# Altium footprint library PCB_ConnectorHDR.PcbLib: 109 footprints (part 3 of 7)
Each footprint in its own frame and in the unit in brackets; x right, y up, seen from the top. Pads: shape width x height; smd on the part's side, far side on the other; paste and mask are expansions set on the pad; w line width, h text height; cw(c..) or ccw(c..) is an arc to the next point about the centre after c.
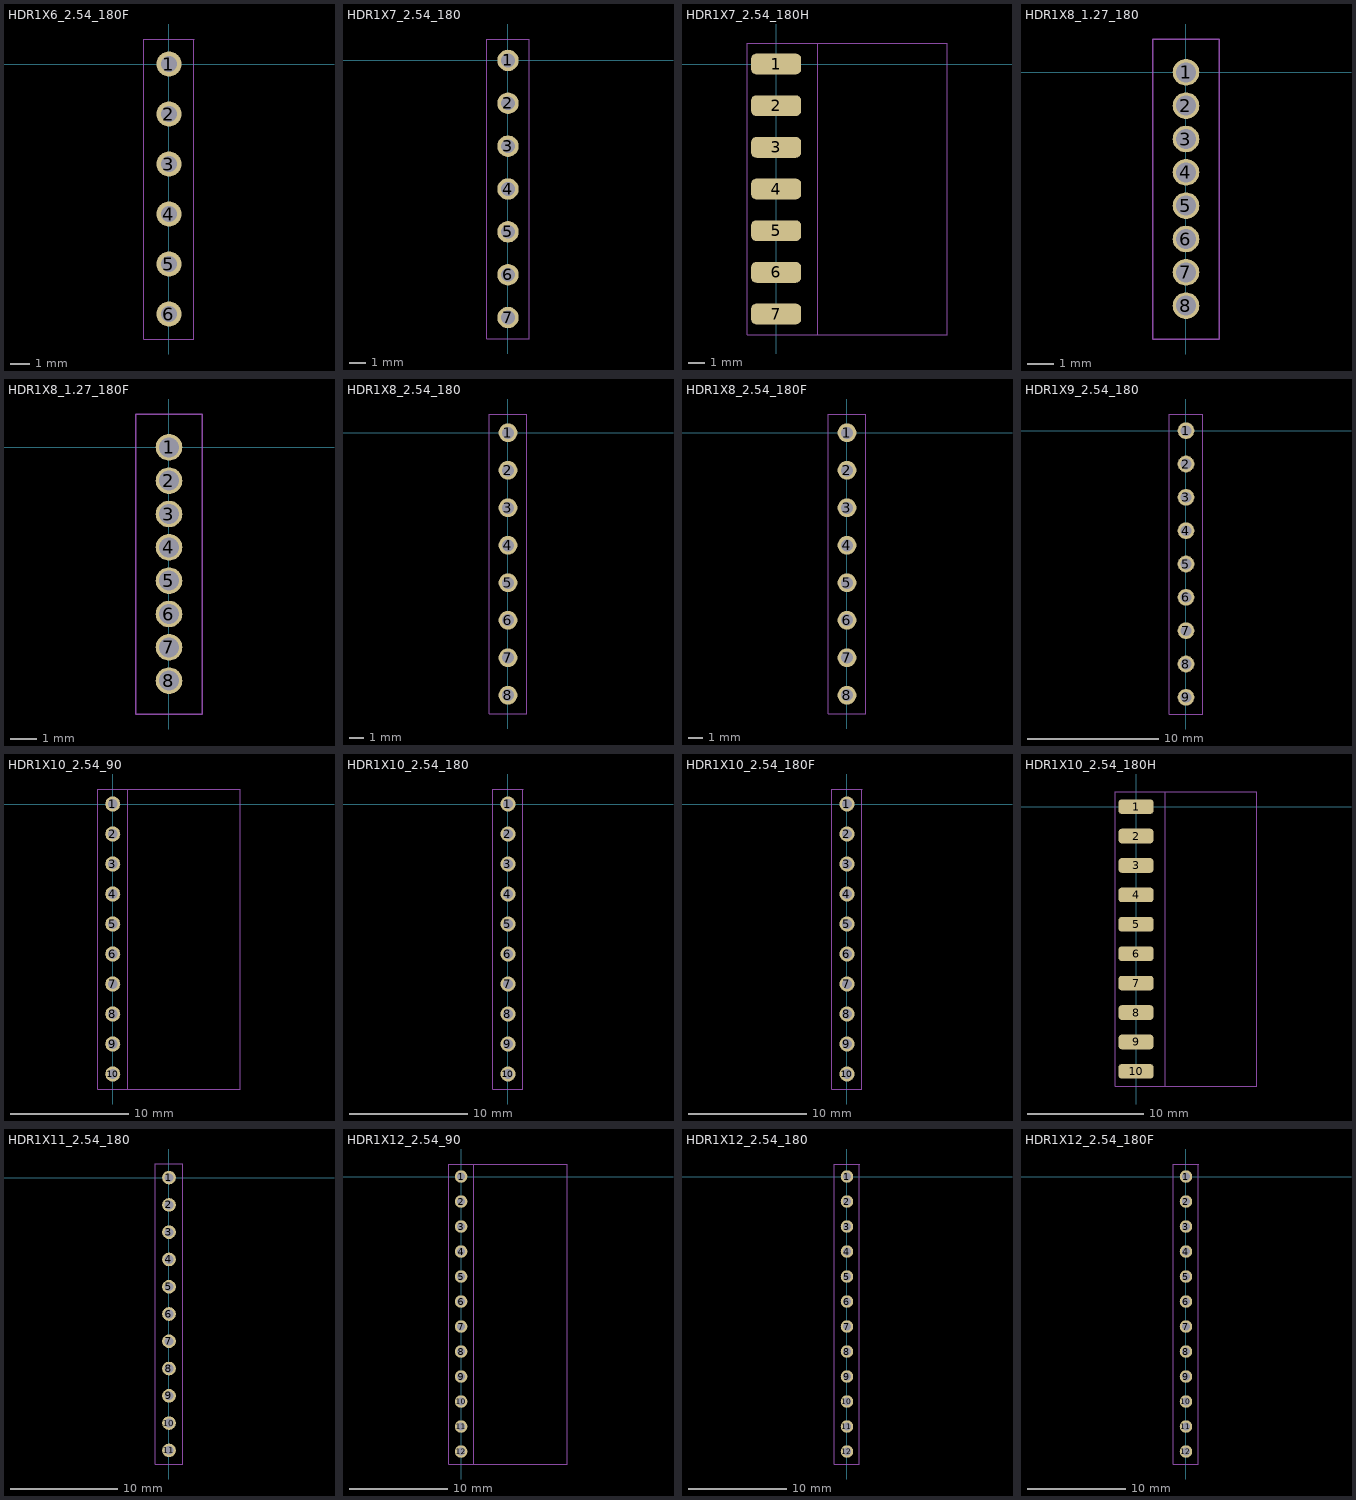
[diagram p2: the footprints below, top view; thin cyan lines are the x and y axes]

## HDR1X6_2.54_180F [mil]
height 169.29
pads (6):
  round 50 hole 32: 1(0,0) 2(0,-100) 3(0,-200) 4(0,-300) 5(0,-400) 6(0,-500)
Mechanical 13:
  lines w2: -50,-550 -50,50 50,50 50,-550 -50,-550
T-Component:
  lines w2: -50,-550 50,-550 50,50 -50,50 -50,-550
3D body "female_header_a-bl254-eg-g06d.stp": height 334.65, standoff -125.98, extent -49.21,-554.84 49.21,55

## HDR1X7_2.54_180 [mil]
height 169.29
pads (7):
  round 50 hole 32: 1(0,0) 2(0,-100) 3(0,-200) 4(0,-300) 5(0,-400) 6(0,-500) 7(0,-600)
Mechanical 13:
  lines w2: -50,-650 -50,50 50,50 50,-650 -50,-650
T-Component:
  lines w2: -50,-650 -50,50 50,50 50,-650 -50,-650
3D body "pin_header_aw140-eg-g07d.stp": height 322.83, standoff -118.11, extent -49.18,-650 49.18,50

## HDR1X7_2.54_180H [mil]
height 169.29
pads (7):
  rrect50% 120x50 smd: 1(0,0) 2(0,-100) 3(0,-200) 4(0,-300) 5(0,-400) 6(0,-500) 7(0,-600)
Mechanical 13:
  lines w2: -70,-650 410,-650 410,50 -70,50 -70,-650
T-Component:
  lines w2: -70,-650 -70,50 100,50 100,-650 -70,-650
3D body "pin_header_aw140-eg-g07d.stp": height 61.32, standoff -37.05, extent -35,-650 405.95,50

## HDR1X8_1.27_180 [mil]
height 169.29
pads (8):
  round 40 hole 30: 1(0,0) 2(0,-50) 3(0,-100) 4(0,-150) 5(0,-200) 6(0,-250) 7(0,-300) 8(0,-350)
Mechanical 13:
  lines w2: -50,-400 -50,50 50,50 50,-400 -50,-400
T-Component:
  lines w2: -50,-400 -50,50 50,50 50,-400 -50,-400
3D body "pin_header_a-sl127-eg-z08d.stp": height 210.24, standoff -102.36, extent -49.21,-374.99 49.21,25.01

## HDR1X8_1.27_180F [mil]
height 169.29
pads (8):
  round 40 hole 30: 1(0,0) 2(0,-50) 3(0,-100) 4(0,-150) 5(0,-200) 6(0,-250) 7(0,-300) 8(0,-350)
Mechanical 13:
  lines w2: -50,-400 -50,50 50,50 50,-400 -50,-400
T-Component:
  lines w2: -50,-400 -50,50 50,50 50,-400 -50,-400
3D body "female_header_a-bl127-eg-z08d.stp": height 133.86, standoff -94.49, extent -35.43,-382.88 35.43,32.87

## HDR1X8_2.54_180 [mil]
height 169.29
pads (8):
  round 50 hole 32: 1(0,0) 2(0,-100) 3(0,-200) 4(0,-300) 5(0,-400) 6(0,-500) 7(0,-600) 8(0,-700)
Mechanical 13:
  lines w2: -50,-750 50,-750 50,50 -50,50 -50,-750
T-Component:
  lines w2: -50,-750 -50,50 50,50 50,-750 -50,-750
3D body "pin_header_aw140-eg-g08d.stp": height 322.83, standoff -118.11, extent -49.18,-750 49.18,49.99

## HDR1X8_2.54_180F [mil]
height 169.29
pads (8):
  round 50 hole 32: 1(0,0) 2(0,-100) 3(0,-200) 4(0,-300) 5(0,-400) 6(0,-500) 7(0,-600) 8(0,-700)
Mechanical 13:
  lines w2: -50,-750 50,-750 50,50 -50,50 -50,-750
T-Component:
  lines w2: -50,-750 50,-750 50,50 -50,50 -50,-750
3D body "female_header_a-bl254-eg-g08d.stp": height 334.65, standoff -125.98, extent -49.21,-754.84 49.21,55

## HDR1X9_2.54_180 [mil]
height 169.29
pads (9):
  round 50 hole 32: 1(0,0) 2(0,-100) 3(0,-200) 4(0,-300) 5(0,-400) 6(0,-500) 7(0,-600) 8(0,-700) 9(0,-800)
Mechanical 13:
  lines w2: -50,-850 -50,50 50,50 50,-850 -50,-850
T-Component:
  lines w2: -50,-850 50,-850 50,50 -50,50 -50,-850
3D body "pin_header_aw140-eg-g09d.stp": height 322.83, standoff -118.11, extent -49.18,-849.99 49.18,50

## HDR1X10_2.54_90 [mil]
height 169.29
pads (10):
  round 50 hole 32: 1(0,0) 2(0,-100) 3(0,-200) 4(0,-300) 5(0,-400) 6(0,-500) 7(0,-600) 8(0,-700) 9(0,-800) 10(0,-900)
Mechanical 13:
  lines w2: -50,-950 -50,50 425,50 425,-950 -50,-950
T-Component:
  lines w2: -50,-950 -50,50 50,50 50,-950 -50,-950
3D body "pin_header_aw140-ea-g10g.stp": height 99.21, standoff -93.7, extent -15,-946.06 423.58,46.06

## HDR1X10_2.54_180 [mil]
height 169.29
pads (10):
  round 50 hole 32: 1(0,0) 2(0,-100) 3(0,-200) 4(0,-300) 5(0,-400) 6(0,-500) 7(0,-600) 8(0,-700) 9(0,-800) 10(0,-900)
Mechanical 13:
  lines w2: -50,-950 -50,50 50,50 50,-950 -50,-950
T-Component:
  lines w2: -50,-950 50,-950 50,50 -50,50 -50,-950
3D body "pin_header_aw140-eg-g10d.stp": height 322.83, standoff -118.11, extent -49.18,-950 49.18,50

## HDR1X10_2.54_180F [mil]
height 169.29
pads (10):
  round 50 hole 32: 1(0,0) 2(0,-100) 3(0,-200) 4(0,-300) 5(0,-400) 6(0,-500) 7(0,-600) 8(0,-700) 9(0,-800) 10(0,-900)
Mechanical 13:
  lines w2: -50,-950 50,-950 50,50 -50,50 -50,-950
T-Component:
  lines w2: -50,-950 -50,50 50,50 50,-950 -50,-950
3D body "female_header_a-bl254-eg-g10d.stp": height 334.65, standoff -125.98, extent -49.2,-954.92 49.22,54.92

## HDR1X10_2.54_180H [mil]
height 169.29
pads (10):
  rrect50% 120x50 smd: 1(0,0) 2(0,-100) 3(0,-200) 4(0,-300) 5(0,-400) 6(0,-500) 7(0,-600) 8(0,-700) 9(0,-800) 10(0,-900)
Mechanical 13:
  lines w2: -70,-950 -70,50 410,50 410,-950 -70,-950
T-Component:
  lines w2: -70,-950 100,-950 100,50 -70,50 -70,-950
3D body "pin_header_aw140-eg-g10d.stp": height 61.32, standoff -37.05, extent -35,-950 405.94,50

## HDR1X11_2.54_180 [mil]
height 169.29
pads (11):
  round 50 hole 32: 1(0,0) 2(0,-100) 3(0,-200) 4(0,-300) 5(0,-400) 6(0,-500) 7(0,-600) 8(0,-700) 9(0,-800) 10(0,-900) 11(0,-1000)
Mechanical 13:
  lines w2: -50,-1050 -50,50 50,50 50,-1050 -50,-1050
T-Component:
  lines w2: -50,-1050 -50,50 50,50 50,-1050 -50,-1050
3D body "pin_header_aw140-eg-g11d.stp": height 322.83, standoff -118.11, extent -49.18,-1050 49.18,50

## HDR1X12_2.54_90 [mil]
height 169.29
pads (12):
  round 50 hole 32: 1(0,0) 2(0,-100) 3(0,-200) 4(0,-300) 5(0,-400) 6(0,-500) 7(0,-600) 8(0,-700) 9(0,-800) 10(0,-900) 11(0,-1000) 12(0,-1100)
Mechanical 13:
  lines w2: -50,-1150 -50,50 425,50 425,-1150 -50,-1150
T-Component:
  lines w2: -50,-1150 -50,50 50,50 50,-1150 -50,-1150
3D body "pin_header_aw140-ea-g12g.stp": height 99.21, standoff -93.7, extent -15,-1146.06 423.58,46.06

## HDR1X12_2.54_180 [mil]
height 169.29
pads (12):
  round 50 hole 32: 1(0,0) 2(0,-100) 3(0,-200) 4(0,-300) 5(0,-400) 6(0,-500) 7(0,-600) 8(0,-700) 9(0,-800) 10(0,-900) 11(0,-1000) 12(0,-1100)
Mechanical 13:
  lines w2: -50,-1150 -50,50 50,50 50,-1150 -50,-1150
T-Component:
  lines w2: -50,-1150 -50,50 50,50 50,-1150 -50,-1150
3D body "pin_header_aw140-eg-g12d.stp": height 322.83, standoff -118.11, extent -49.18,-1150 49.18,50

## HDR1X12_2.54_180F [mil]
height 169.29
pads (12):
  round 50 hole 32: 1(0,0) 2(0,-100) 3(0,-200) 4(0,-300) 5(0,-400) 6(0,-500) 7(0,-600) 8(0,-700) 9(0,-800) 10(0,-900) 11(0,-1000) 12(0,-1100)
Mechanical 13:
  lines w2: -50,-1150 -50,50 50,50 50,-1150 -50,-1150
T-Component:
  lines w2: -50,-1150 -50,50 50,50 50,-1150 -50,-1150
3D body "female_header_a-bl254-eg-g12d.stp": height 334.65, standoff -125.98, extent -49.21,-1154.92 49.21,54.92